# Altium footprint library B38.PcbLib: 42 footprints (part 1 of 3)
Each footprint in its own frame and in the unit in brackets; x right, y up, seen from the top. Pads: shape width x height; smd on the part's side, far side on the other; paste and mask are expansions set on the pad; w line width, h text height; cw(c..) or ccw(c..) is an arc to the next point about the centre after c.
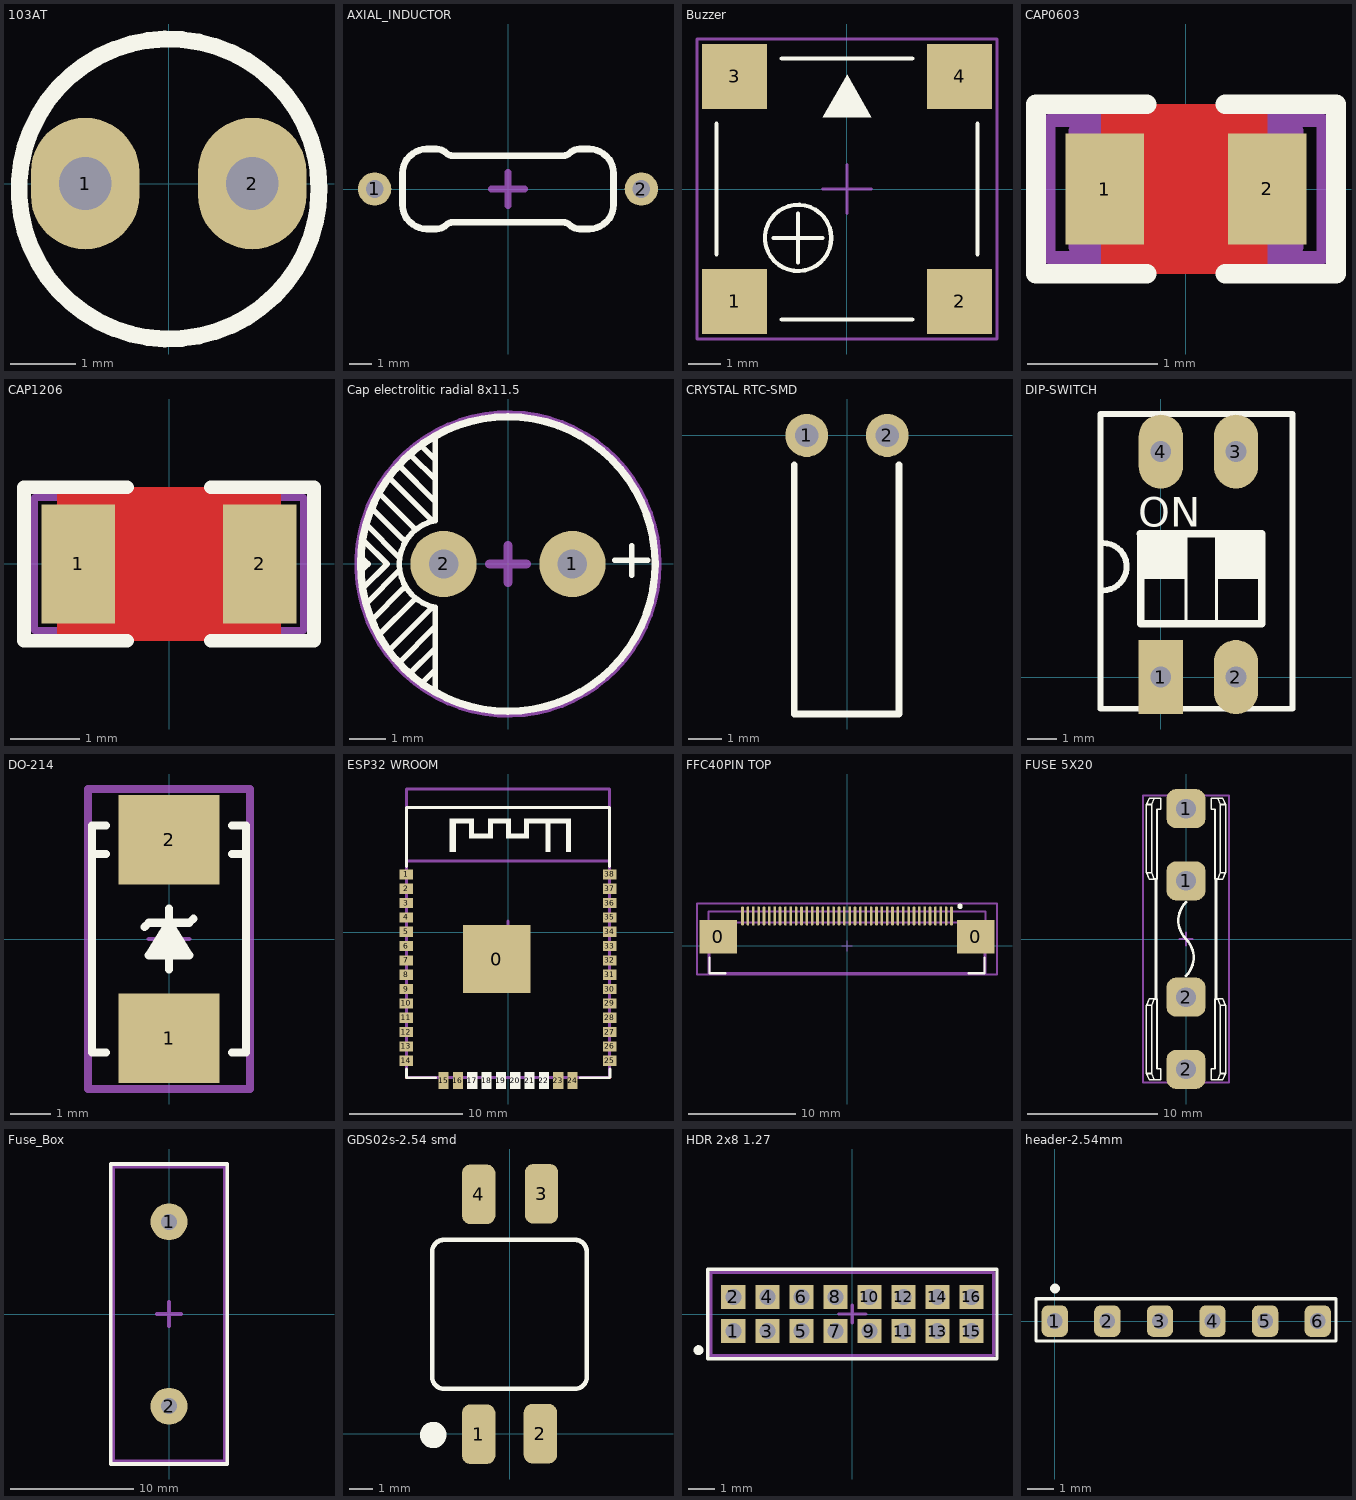
[diagram p0: the footprints below, top view; thin cyan lines are the x and y axes]

## 103AT [mm]
pads (2):
  oval 1.65x2 hole 0.8: 1(-1.27,0) 2(1.27,0)
Top Overlay:
  circle w0.254: c0.005,-0.083 r2.28

## AXIAL_INDUCTOR [mm]
pads (2):
  round 1.5 / inner round 1.8 / far side round 1.8 hole 0.8 mask+0.05: 1(-6,0) 2(6,0)
Top Overlay:
  lines w0.3: -4.75,-0.7 ccw(c-3.65,-0.7) -3.65,-1.8 -3.233,-1.8 ccw(c-3.233,-1.117) -2.75,-1.6 cw(c-2.509,-1.841) -2.509,-1.5 2.509,-1.5 cw(c2.509,-1.841) 2.75,-1.6 ccw(c3.233,-1.117) 3.233,-1.8 3.65,-1.8 ccw(c3.65,-0.7) 4.75,-0.7 4.75,0.7 ccw(c3.65,0.7) 3.65,1.8 3.233,1.8 ccw(c3.233,1.117) 2.75,1.6 cw(c2.509,1.841) 2.509,1.5 -2.509,1.5 cw(c-2.509,1.841) -2.75,1.6 ccw(c-3.233,1.117) -3.233,1.8 -3.65,1.8 ccw(c-3.65,0.7) -4.75,0.7 -4.75,-0.7
Mechanical 15:
  lines w0.3: -0.75,0 0.75,0 ; 0,-0.75 0,0.75
3D body "Inductor.stp": height 4.02, standoff -2.05, extent -6.26,-1.936 6.255,1.936

## Buzzer [mm]
height 1.14
pads (4):
  rect 2x2 smd: 1(-3.45,-3.45) 2(3.45,-3.45) 3(-3.45,3.45) 4(3.45,3.45)
Top Overlay:
  circle w0.127: c-1.5,-1.5 r1.016
  region: 0.75,2.2 -0.75,2.2 0,3.499
  lines w0.127: -4,-2 -4,2 ; -2.25,-1.5 -0.75,-1.5 ; -2,-4 2,-4 ; -2,4 2,4 ; -1.5,-2.25 -1.5,-0.75 ; 4,-2 4,2
Mechanical 15:
  lines w0.1: -0.75,0 0.75,0 ; 0,-0.75 0,0.75 ; -4.6,-4.6 4.6,-4.6 4.6,4.6 -4.6,4.6 -4.6,-4.6
3D body "User Library-MLT-8530.step": height 3, standoff 0, extent -4.25,-4.25 4.25,4.25

## CAP0603 [mm]
pads (2):
  rect 0.6x0.85 smd: 1(-0.622,0) 2(0.622,0)
Top Layer:
  pour cut-out: -0.65,0.65 -0.65,-0.65 0.622,-0.65 0.622,0.65
Top Overlay:
  lines w0.15: -0.3,-0.65 -1.15,-0.65 -1.15,0.65 -0.3,0.65 ; 0.3,-0.65 1.15,-0.65 1.15,0.65 0.3,0.65
Mechanical 13:
  lines w0.1: -0.85,-0.45 -0.85,0.45 0.85,0.45 0.85,-0.45 -0.85,-0.45
Mechanical 15:
  lines w0.1: -0.2,0 0.2,0 ; 0,-0.2 0,0.2 ; -1.05,-0.525 -1.05,0.525 1.05,0.525 1.05,-0.525 -1.05,-0.525
3D body "CAP0603.step": height 0.4, standoff 0, extent -0.825,-0.425 0.825,0.425

## CAP1206 [mm]
height 2
pads (2):
  rect 1.05x1.7 smd: 1(-1.3,0) 2(1.3,0)
Top Layer:
  pour cut-out: -1.6,1.1 1.6,1.1 1.6,-1.1 -1.6,-1.1
Top Overlay:
  lines w0.2: -0.6,-1.1 -2.08,-1.1 -2.08,1.1 -0.6,1.1 ; 0.6,-1.1 2.08,-1.1 2.08,1.1 0.6,1.1
Mechanical 13:
  lines w0.1: -1.6,-0.8 -1.6,0.8 1.6,0.8 1.6,-0.8 -1.6,-0.8
Mechanical 15:
  lines w0.1: -0.5,0 0.5,0 ; 0,-0.5 0,0.5 ; -1.93,-0.95 1.93,-0.95 1.93,0.95 -1.93,0.95 -1.93,-0.95
3D body "CAP1206.step": height 0.94, standoff 0, extent -1.65,-0.85 1.65,0.85

## Cap electrolitic radial 8x11.5 [mm]
height 2
pads (2):
  round 1.8 hole 0.8: 1(1.75,0) 2(-1.75,0)
Top Overlay:
  circle w0.2: c-0.004,0 r4
  lines w0.15: -4.02,-0.22 -3.8,0 -4.002,0.202 ; -3.934,-0.654 -3.28,0 -3.934,0.654 ; -3.861,1.081 -2.942,0.162 ; -3.847,-1.067 -2.942,-0.162 ; -3.697,-1.517 -2.849,-0.669 ; -3.692,1.512 -2.848,0.668 ; -3.504,1.924 -2.556,0.976 ; -3.502,-1.922 -2.553,-0.973 ; -3.233,-2.353 -2.102,-1.222 ; -3.229,2.349 -2.061,1.181 -1.98,1.181 -1.98,3.442 ; -2.968,2.688 -1.98,1.7 ; -2.966,-2.686 -1.98,-1.7 ; -2.671,-2.981 -1.98,-2.3 ; -2.617,2.937 -1.98,2.312 ; -2.372,3.228 -1.98,2.843 ; -2.352,-3.247 -1.98,-2.881 ; -1.983,1.177 ccw(c-1.75,0) -1.982,-1.177 ; -1.98,-3.436 -1.98,-1.177 ; 2.9,0.1 3.8,0.1 ; 3.361,-0.3 3.361,0.5
Mechanical 15:
  circle w0.2: c0,0 r4.075
  lines w0.254: -0.5,0 0.5,0 ; 0,-0.5 0,0.5
3D body "User Library-Cap electro 8x11_5x3_5mm.step": height 12.03, standoff -3.48, extent -4.025,-4.025 4.025,4.025

## CRYSTAL RTC-SMD [mm] "Crystal Oscillator"
pads (2):
  round 1.3 hole 0.7: 1(-1.219,0) 2(1.219,0)
Top Overlay:
  lines w0.2: -1.6,-0.889 -1.6,-8.433 1.575,-8.433 1.575,-0.889
3D body "User Library-XTAL.STEP": height 2.55, standoff -1.37, extent -1.41,-8.305 1.372,0.076

## DIP-SWITCH [mm]
pads (4):
  rect 1.5x2.5 hole 0.7: 1(0,0)
  oval 1.5x2.5 hole 0.7: 2(2.54,0) 3(2.54,7.62) 4(0,7.62)
Top Overlay:
  region: -0.689,4.844 -0.689,3.319 0.867,3.319 0.867,4.844
  region: 1.861,4.844 1.861,3.319 3.417,3.319 3.417,4.844
  lines w0.1: 0.857,1.794 0.857,4.814 ; 1.877,1.794 1.877,4.814
  lines w0.2: -1.953,2.929 ccw(c-1.953,3.729) -1.953,4.53 ; -2.033,-1.073 4.456,-1.073 4.456,8.89 -2.033,8.89 -2.033,-1.073
  lines w0.25: -0.673,1.794 -0.673,4.814
  lines w0.254: -0.689,4.844 3.417,4.844 3.417,1.794 -0.673,1.794
  text "ON" at -0.762,5.08 h1
3D body "DS1040-02 (DIP_switch).stp": height 6.8, standoff -3.85, extent -2,-1.137 4.54,8.763

## DO-214 [mm]
height 2
pads (2):
  rect 2.5x2.2 smd mask+0.051: 1(0,-2.45) 2(0,2.45)
Top Overlay:
  region: 0,0.4 0.5,-0.4 -0.5,-0.4
  lines w0.2: -1.9,2.1 -1.55,2.1 ; -1.55,-2.8 -1.9,-2.8 -1.9,2.8 -1.55,2.8 ; -0.6,0.3 -0.5,0.4 0.5,0.4 0.6,0.5 ; 0,-0.75 0,0.75 ; 1.55,-2.8 1.9,-2.8 1.9,2.8 1.55,2.8 ; 1.55,2.1 1.9,2.1 ; -0.5,-0.4 0.5,-0.4 0,0.4 -0.5,-0.4
Mechanical 15:
  lines w0.1: -0.5,0 0.5,0 ; 0,-0.5 0,0.5
  lines w0.2: -2,-3.7 -2,3.7 2,3.7 2,-3.7 -2,-3.7
3D body "User Library-DO-214AA SMB.step": height 2.3, standoff 0, extent -1.8,-2.7 1.8,2.7

## ESP32 WROOM [mm]
pads (39):
  rect 6x6 smd paste-2.25: 0(-0.996,-2.37)
  rect 1.2x0.9 smd: 1(-9,5.13) 2(-9,3.86) 3(-9,2.59) 4(-9,1.32) 5(-9,0.05) 6(-9,-1.22) 7(-9,-2.49) 8(-9,-3.76) 9(-9,-5.03) 10(-9,-6.3) 11(-9,-7.57) 12(-9,-8.84) 13(-9,-10.11) 14(-9,-11.38) 25(9,-11.38) 26(9,-10.11) 27(9,-8.84) 28(9,-7.57) 29(9,-6.3) 30(9,-5.03) 31(9,-3.76) 33(9,-1.22) 34(9,0.05) 35(9,1.32) 36(9,2.59) 37(9,3.86) 38(9,5.13)
  rect 0.9x1.5 smd: 15(-5.711,-13.134) 16(-4.441,-13.134) 23(4.449,-13.134) 24(5.719,-13.134)
  rect 0.9x1.5 on Top Overlay: 17(-3.171,-13.134) 18(-1.901,-13.134) 19(-0.631,-13.134) 20(0.639,-13.134) 21(1.909,-13.134) 22(3.179,-13.134)
  rect 1.2x0.9 smd paste+0: 32(9,-2.49)
Top Overlay:
  region: 5.55,7.15 5.15,7.15 5.15,9.65 3.75,9.65 3.75,7.15 3.35,7.15 3.35,9.65 1.85,9.65 1.85,8.35 -0.15,8.35 -0.15,9.65 -1.35,9.65 -1.35,8.35 -3.45,8.35 -3.45,9.65 -4.65,9.65 -4.65,7.15 -5.15,7.15 -5.15,10.05 -3.05,10.05 -3.05,8.75 -1.75,8.75 -1.75,10.05 0.25,10.05 0.25,8.75 1.45,8.75 1.45,10.05 5.55,10.05
  lines w0.254: -8.988,-12.098 -8.988,-12.886 -6.422,-12.886 ; -8.988,5.834 -8.988,11.05 9.004,11.05 9.004,5.834 ; 6.43,-12.886 8.998,-12.886 9.021,-12.863 9.021,-12.098
Top Paste:
  rectangle: -3.742,-5.109 -2.242,-3.609
  rectangle: -1.742,-5.109 -0.242,-3.609
  rectangle: 0.258,-5.109 1.758,-3.609
  rectangle: -3.742,-3.109 -2.242,-1.609
  rectangle: -1.742,-3.109 -0.242,-1.609
  rectangle: 0.258,-3.109 1.758,-1.609
  rectangle: -3.742,-1.109 -2.242,0.391
  rectangle: -1.742,-1.109 -0.242,0.391
  rectangle: 0.258,-1.109 1.758,0.391
Mechanical 15:
  lines w0.25: -0.988,-0.002 1.012,-0.002 ; 0,-1 0,1
  lines w0.254: -9,-12.88 9,-12.88 ; -9,12.695 9,12.695 9.004,12.691 9.004,-12.88 ; -8.996,-12.88 -8.996,12.62 ; -8.996,6.32 9.004,6.32
3D body "KiCAD-ESP-WROOM-32.step": height 3.04, standoff 0, extent -9.035,-12.94 9.035,12.6

## FFC40PIN TOP [mm]
pads (42):
  rect 3.5x3.1 smd paste+0: 0(-12.02,0.85) 0(12.02,0.85)
  oval 0.25x1.8 smd paste+0: 1(9.75,2.8) 2(9.25,2.8) 3(8.75,2.8) 4(8.25,2.8) 5(7.75,2.8) 6(7.25,2.8) 7(6.75,2.8) 8(6.25,2.8) 9(5.75,2.8) 10(5.25,2.8) 11(4.75,2.8) 12(4.25,2.8) 13(3.75,2.8) 14(3.25,2.8) 15(2.75,2.8) 16(2.25,2.8) 17(1.75,2.8) 18(1.25,2.8) 19(0.75,2.8) 20(0.25,2.8) 21(-0.25,2.8) 22(-0.75,2.8) 23(-1.25,2.8) 24(-1.75,2.8) 25(-2.25,2.8) 26(-2.75,2.8) 27(-3.25,2.8) 28(-3.75,2.8) 29(-4.25,2.8) 30(-4.75,2.8) 31(-5.25,2.8) 32(-5.75,2.8) 33(-6.25,2.8) 34(-6.75,2.8) 35(-7.25,2.8) 36(-7.75,2.8) 37(-8.25,2.8) 38(-8.75,2.8) 39(-9.25,2.8) 40(-9.75,2.8)
Top Overlay:
  circle w0.25: c10.55,3.7 r0.125
  lines w0.2: -12.84,-1.075 -12.84,-2.55 -11.365,-2.55 ; 11.365,-2.55 12.84,-2.55 12.84,-1.075
Bottom 3D Body:
  lines w0.2: -12.94,-2.65 -12.94,3.2 12.94,3.2 12.94,-2.65 -12.94,-2.65
  text ".Designator" at 0,0.275 h1
Mechanical 12:
  lines w0.2: -12.84,-2.55 -12.84,2.2 12.84,2.2 12.84,-2.55 -12.84,-2.55
Mechanical 15:
  lines w0.1: -0.5,0 0.5,0 ; 0,-0.5 0,0.5
  lines w0.2: -14,-2.65 -14,3.95 14,3.95 14,-2.65 -14,-2.65
3D body "Conn_TE_Connectivity_-_AMP_4-1734592-0_eec.STEP": height 0.25, standoff 0, extent -12.94,-2.65 12.94,3.2

## FUSE 5X20 [mm] "Dsigner : Abbas Basereh"
height 8
pads (4):
  rrect50% 3x3 hole 1.5: 1(0,4.45) 1(0,10) 2(0,-10) 2(0,-4.45)
Top Overlay:
  drawing of 240 lines, arcs and shapes, not listed
Mechanical 15:
  lines w0.15: -0.5,0 0.5,0 ; 0,-0.5 0,0.5 ; -3.3,-11 3.3,-11 3.3,11 -3.3,11 -3.3,-11
3D body "User Library-FH-100.step": height 9.99, standoff -3.5, extent -3.5,4.844 3.5,10.444
3D body "User Library-FH-100.step": height 9.99, standoff -3.5, extent -3.5,-10.444 3.5,-4.844

## Fuse_Box [mm]
height 2
pads (2):
  round 3 hole 1.3: 1(0,7.5) 2(0,-7.5)
Top Overlay:
  lines w0.3: -4.741,-12.2 -4.741,12.2 4.741,12.2 4.741,-12.2 -4.741,-12.2
Mechanical 15:
  lines w0.3: -1,0 1,0 ; 0,-1 0,1 ; -4.541,-12 -4.541,12 4.541,12 4.541,-12 -4.541,-12
3D body "User Library-part 8.STEP": height 13.46, standoff -2.4, extent -4.541,-12 4.541,12

## GDS02s-2.54 smd [mm]
pads (4):
  rrect50% 1.4x2.5 smd: 1(-1.295,-0.013) 2(1.295,0.013) 3(1.346,10.084) 4(-1.295,10.058)
Top Overlay:
  circle w0.762: c-3.203,-0.043 r0.17
  lines w0.2: -3.246,2.393 ccw(c-2.746,2.393) -2.746,1.892 ; -3.246,7.653 cw(c-2.746,7.653) -2.746,8.153 ; -3.245,2.407 -3.245,7.645 ; -2.764,8.153 2.779,8.153 ; -2.73,1.892 2.756,1.892 ; 2.743,8.153 cw(c2.743,7.653) 3.244,7.653 ; 2.746,1.892 ccw(c2.746,2.393) 3.246,2.393 ; 3.244,2.38 3.244,7.688
3D body "Deep Switch 2P.STEP": height 4.55, standoff 0, extent -3.1,-0.31 3.1,10.09

## HDR 2x8 1.27 [mm]
pads (16):
  rect 0.9x0.9 hole 0.6 mask+0.051: 1(-4.445,-0.635) 2(-4.445,0.635) 3(-3.175,-0.635) 4(-3.175,0.635) 5(-1.905,-0.635) 6(-1.905,0.635) 7(-0.635,-0.635) 8(-0.635,0.635) 9(0.635,-0.635) 10(0.635,0.635) 11(1.905,-0.635) 12(1.905,0.635) 13(3.175,-0.635) 14(3.175,0.635) 15(4.445,-0.635) 16(4.445,0.635)
Top Overlay:
  circle w0.254: c-5.743,-1.35 r0.057
  lines w0.127: -5.4,-1.67 -5.4,1.67 5.4,1.67 5.4,-1.67 -5.4,-1.67
Mechanical 15:
  lines w0.127: -0.508,0 0.508,0 ; 0,-0.33 0,0.33 ; -5.28,-1.55 -5.28,1.55 5.28,1.55 5.28,-1.55 -5.28,-1.55
3D body "female_header_a-bl127-dg-g16d.stp": height 3.4, standoff -2.4, extent -5.28,-1.55 5.28,1.55

## header-2.54mm [mm]
pads (6):
  rrect50% 1x1.2 hole 0.6 mask+0.051: 1(0,0) 2(2,0) 3(4,0) 4(6,0) 5(8,0) 6(10,0)
Top Overlay:
  circle w0.254: c0.01,1.24 r0.057
  lines w0.127: -0.711,-0.757 -0.711,0.848 10.693,0.848 10.693,-0.757 -0.711,-0.757